# Altium footprint library CAP_TH.PcbLib: 220 footprints (part 14 of 14)
Each footprint in its own frame and in the unit in brackets; x right, y up, seen from the top. Pads: shape width x height; smd on the part's side, far side on the other; paste and mask are expansions set on the pad; w line width, h text height; cw(c..) or ccw(c..) is an arc to the next point about the centre after c.
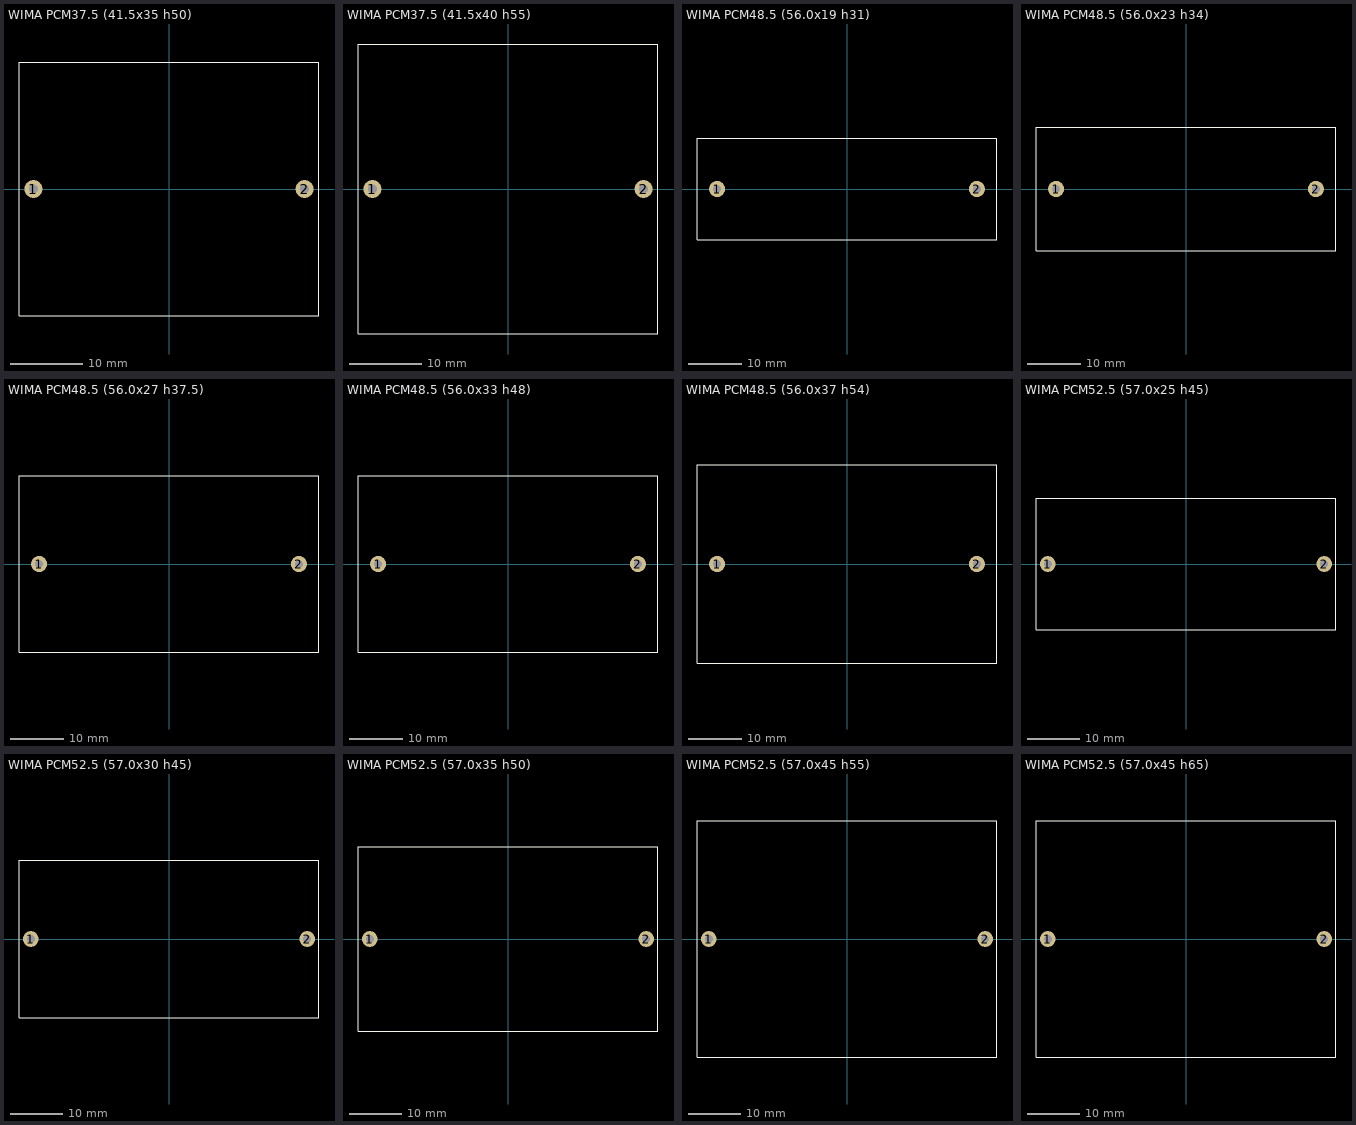
[diagram p13: the footprints below, top view; thin cyan lines are the x and y axes]

## WIMA PCM37.5 (41.5x35 h50) [mm]
pads (2):
  round 2.5 hole 1.2: 1(-18.75,0) 2(18.75,0)
Top Overlay:
  lines w0.1: -20.75,-17.5 -20.75,17.5 20.75,17.5 20.75,-17.5 -20.75,-17.5
3D body "WIMA PCM37.5 (41.5x35 h50).STEP": height 50, standoff -2, extent -20.75,-17.5 20.75,17.5

## WIMA PCM37.5 (41.5x40 h55) [mm]
pads (2):
  round 2.5 hole 1.2: 1(-18.75,0) 2(18.75,0)
Top Overlay:
  lines w0.1: -20.75,-20 20.75,-20 20.75,20 -20.75,20 -20.75,-20
3D body "WIMA PCM37.5 (41.5x40 h55).STEP": height 55, standoff -2, extent -20.75,-20 20.75,20

## WIMA PCM48.5 (56.0x19 h31) [mm]
pads (2):
  round 3 hole 1.5: 1(-24.25,0) 2(24.25,0)
Top Overlay:
  lines w0.1: -28,-9.5 28,-9.5 28,9.5 -28,9.5 -28,-9.5
3D body "WIMA PCM48.5 (56.0x19 h31).STEP": height 31, standoff -2, extent -28,-9.5 28,9.5

## WIMA PCM48.5 (56.0x23 h34) [mm]
pads (2):
  round 3 hole 1.5: 1(-24.25,0) 2(24.25,0)
Top Overlay:
  lines w0.1: -28,-11.5 -28,11.5 28,11.5 28,-11.5 -28,-11.5
3D body "WIMA PCM48.5 (56.0x23 h34).STEP": height 34, standoff -2, extent -28,-11.5 28,11.5

## WIMA PCM48.5 (56.0x27 h37.5) [mm]
pads (2):
  round 3 hole 1.5: 1(-24.25,0) 2(24.25,0)
Top Overlay:
  lines w0.1: -28,-16.5 -28,16.5 28,16.5 28,-16.5 -28,-16.5
3D body "WIMA PCM48.5 (56.0x27 h37.5).STEP": height 48, standoff -2, extent -28,-16.5 28,16.5

## WIMA PCM48.5 (56.0x33 h48) [mm]
pads (2):
  round 3 hole 1.5: 1(-24.25,0) 2(24.25,0)
Top Overlay:
  lines w0.1: -28,-16.5 28,-16.5 28,16.5 -28,16.5 -28,-16.5
3D body "WIMA PCM48.5 (56.0x33 h48).STEP": height 48, standoff -2, extent -28,-16.5 28,16.5

## WIMA PCM48.5 (56.0x37 h54) [mm]
pads (2):
  round 3 hole 1.5: 1(-24.25,0) 2(24.25,0)
Top Overlay:
  lines w0.1: -28,-18.5 28,-18.5 28,18.5 -28,18.5 -28,-18.5
3D body "WIMA PCM48.5 (56.0x37 h54).STEP": height 54, standoff -2, extent -28,-18.5 28,18.5

## WIMA PCM52.5 (57.0x25 h45) [mm]
pads (2):
  round 3 hole 1.5: 1(-26.25,0) 2(26.25,0)
Top Overlay:
  lines w0.1: -28.5,-12.5 -28.5,12.5 28.5,12.5 28.5,-12.5 -28.5,-12.5
3D body "WIMA PCM52.5 (57.0x25 h45).STEP": height 45, standoff -2, extent -28.5,-12.5 28.5,12.5

## WIMA PCM52.5 (57.0x30 h45) [mm]
pads (2):
  round 3 hole 1.5: 1(-26.25,0) 2(26.25,0)
Top Overlay:
  lines w0.1: -28.5,-15 28.5,-15 28.5,15 -28.5,15 -28.5,-15
3D body "WIMA PCM52.5 (57.0x30 h45).STEP": height 45, standoff -2, extent -28.5,-15 28.5,15

## WIMA PCM52.5 (57.0x35 h50) [mm]
pads (2):
  round 3 hole 1.5: 1(-26.25,0) 2(26.25,0)
Top Overlay:
  lines w0.1: -28.5,-17.5 -28.5,17.5 28.5,17.5 28.5,-17.5 -28.5,-17.5
3D body "WIMA PCM52.5 (57.0x35 h50).STEP": height 50, standoff -2, extent -28.5,-17.5 28.5,17.5

## WIMA PCM52.5 (57.0x45 h55) [mm]
pads (2):
  round 3 hole 1.5: 1(-26.25,0) 2(26.25,0)
Top Overlay:
  lines w0.1: -28.5,-22.5 28.5,-22.5 28.5,22.5 -28.5,22.5 -28.5,-22.5
3D body "WIMA PCM52.5 (57.0x45 h55).STEP": height 55, standoff -2, extent -28.5,-22.5 28.5,22.5

## WIMA PCM52.5 (57.0x45 h65) [mm]
pads (2):
  round 3 hole 1.5: 1(-26.25,0) 2(26.25,0)
Top Overlay:
  lines w0.1: -28.5,-22.5 -28.5,22.5 28.5,22.5 28.5,-22.5 -28.5,-22.5
3D body "WIMA PCM52.5 (57.0x45 h65).STEP": height 65, standoff -2, extent -28.5,-22.5 28.5,22.5